# Altium footprint library Connectors.PcbLib: 20 footprints (part 1 of 2)
Each footprint in its own frame and in the unit in brackets; x right, y up, seen from the top. Pads: shape width x height; smd on the part's side, far side on the other; paste and mask are expansions set on the pad; w line width, h text height; cw(c..) or ccw(c..) is an arc to the next point about the centre after c.
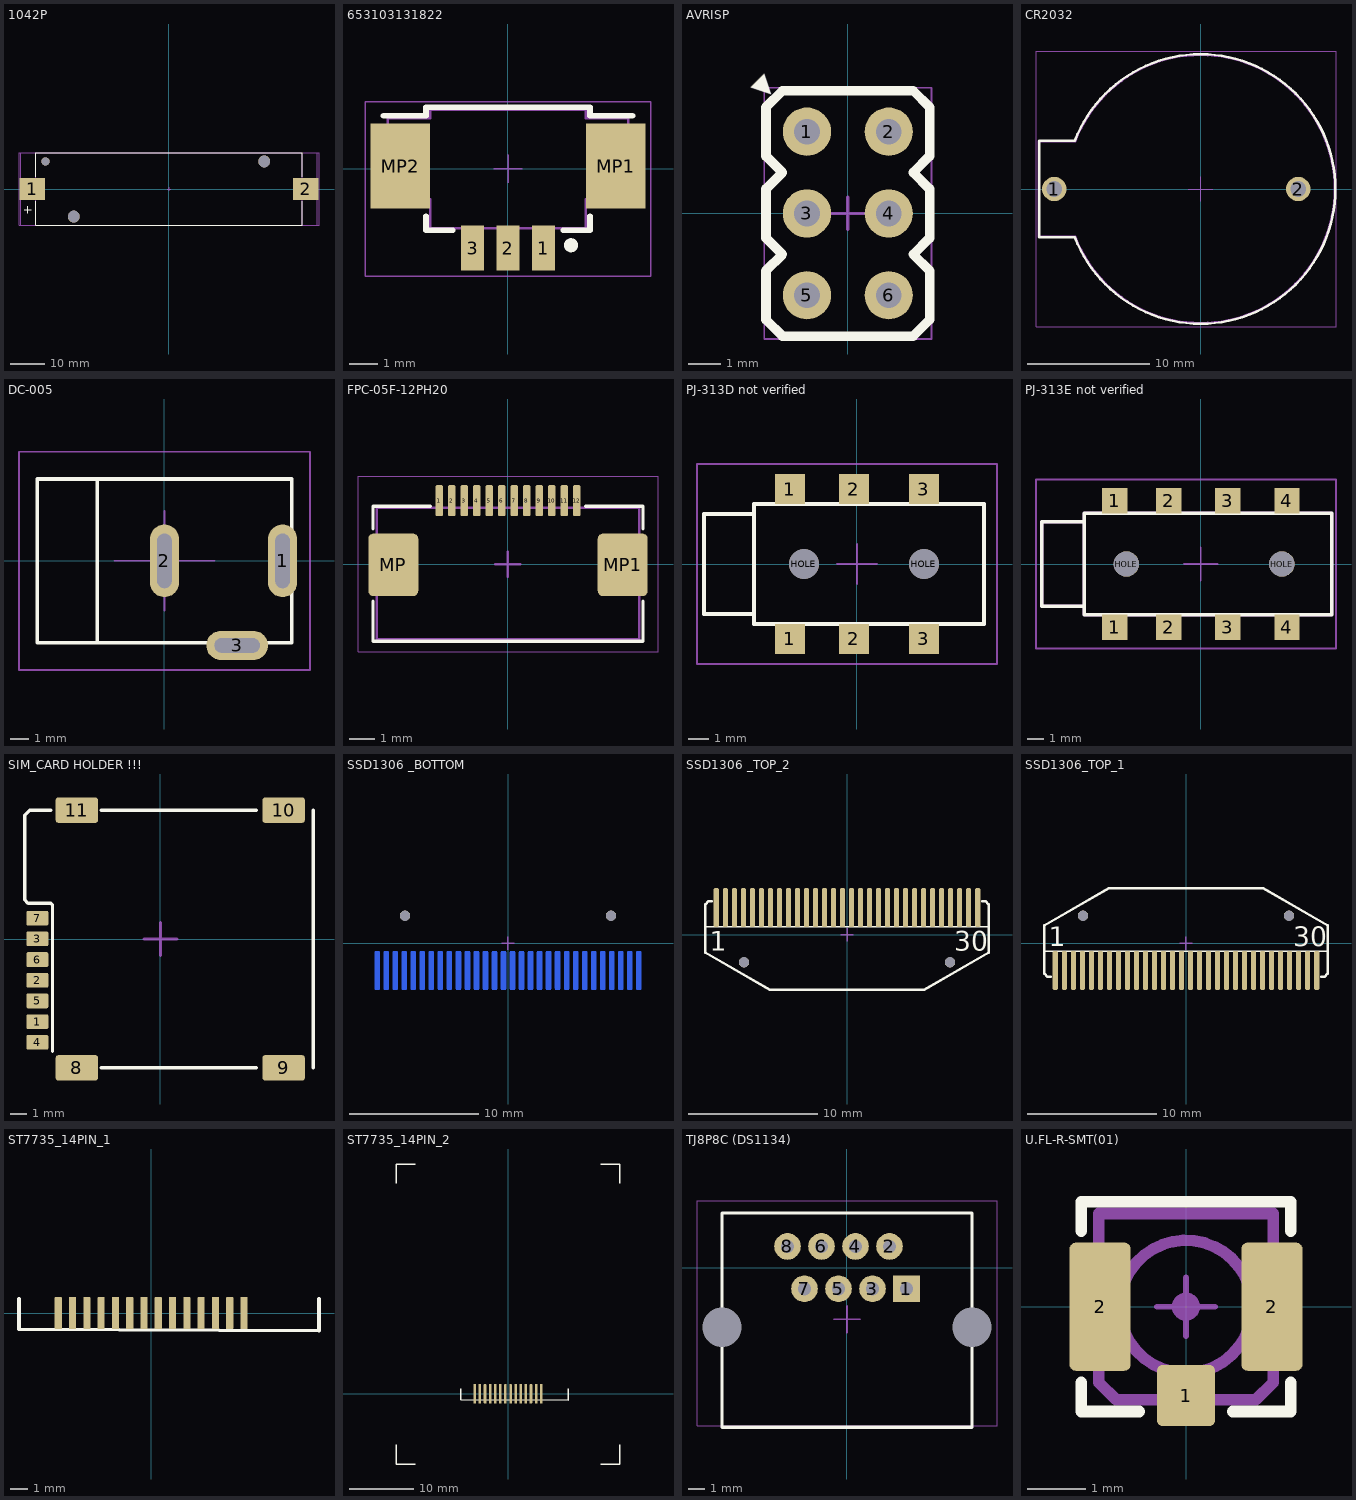
[diagram p0: the footprints below, top view; thin cyan lines are the x and y axes]

## 1042P [mil]
pads (5):
  rect 294x255 smd paste+0 mask+0: 1(-1562.35,0) 2(1562.65,0)
  round 94 hole 94 unplated paste-99999 mask+0: ""(-1411.35,315)
  round 135.83 hole 135.83 unplated paste-99999 mask+0: ""(-1087.35,-315) ""(1087.65,315)
Top Overlay:
  lines w7.87: -1653.54,-236.22 -1574.8,-236.22 ; -1614.17,-275.59 -1614.17,-196.85 ; -1521.85,-142.13 -1521.85,-411.5 1522.15,-411.5 1522.15,-142.13 ; -1521.85,142.13 -1521.85,411.5 1522.15,411.5 1522.15,142.13
Top Assembly:
  lines w7.87: -1692.91,-415.44 -1692.91,415.44 1692.91,415.44 1692.91,-415.44 -1692.91,-415.44
Top 3D Body:
  lines w7.87: -1521.85,-411.5 1522.15,-411.5 1522.15,411.5 -1521.85,411.5 -1521.85,-411.5
Top Courtyard:
  lines w7.87: -1713.29,-415.44 1713.58,-415.44 1713.58,415.44 -1713.29,415.44 -1713.29,-415.44
Top Component Center:
  lines w3.94: -19.54,0 19.83,0 ; 0.15,-19.68 0.15,19.68
3D body "Batt_Keystone_1042P_eec.STEP": height 594.88, standoff -135, extent -1692.86,-406.5 1693.14,406.54

## 653103131822 [mm]
pads (5):
  rect 0.81x1.6 smd: 1(1.25,-2.8) 2(0,-2.8) 3(-1.25,-2.8)
  rect 2.1x3 smd: MP1(3.8,0.1) MP2(-3.8,0.1)
Top Overlay:
  circle w0.25: c2.225,-2.7 r0.125
  lines w0.2: -4.4,1.875 -2.9,1.875 -2.9,2.175 2.9,2.175 2.9,1.875 4.4,1.875 ; -2.9,-1.675 -2.9,-2.175 -1.95,-2.175 ; 1.95,-2.175 2.9,-2.175 2.9,-1.675
Top Assembly:
  lines w0.1: -4.25,1.78 -4.25,-1.08 -2.75,-1.08 -2.75,-2.1 2.75,-2.1 2.75,-1.08 4.25,-1.08 4.25,1.78 ; -4.23,1.8 -2.75,1.8 -2.75,2.1 2.75,2.1 2.75,1.8 4.23,1.8
Top Courtyard:
  lines w0.05: -5.05,-3.8 5.05,-3.8 5.05,2.375 -5.05,2.375 -5.05,-3.8
Top Component Center:
  lines w0.05: -0.5,0 0.5,0 ; 0,-0.5 0,0.5
3D body "653103131822.stp": height 3.4, standoff -0.01, extent -4.25,-3.3 4.25,2.1

## AVRISP [mm]
pads (6):
  round 1.5 hole 0.8 mask+0.05: 1(-1.27,2.54) 2(1.27,2.54) 3(-1.27,0) 4(1.27,0) 5(-1.27,-2.54) 6(1.27,-2.54)
Top Overlay:
  lines w0.3: -2.54,-3.302 -2.032,-3.81 2.032,-3.81 2.54,-3.302 2.54,-1.778 2.032,-1.27 2.54,-0.762 2.54,0.762 2.032,1.27 2.54,1.778 2.54,3.302 2.032,3.81 -2.032,3.81 -2.54,3.302 -2.54,1.778 -2.032,1.27 -2.54,0.762 -2.54,-0.762 -2.032,-1.27 -2.54,-1.778 -2.54,-3.302
  text "▲" at -2.651,4.417 h1
Top Courtyard:
  lines w0.05: -2.6,-3.9 2.6,-3.9 2.6,3.9 -2.6,3.9 -2.6,-3.9
Top Component Center:
  lines w0.1: -0.5,0 0.5,0 ; 0,-0.5 0,0.5

## CR2032 [mm] "KLS5-CR2032-01 (BH-642) (CH224-2032)"
pads (2):
  round 2 hole 1.3 mask+0.05: 1(-12,0) 2(8,0)
Top Overlay:
  lines w0.2: -10.321,-3.95 -13.25,-3.95 -13.25,3.95 -10.321,3.95 ; -10.321,-3.948 ccw(c0,0) -10.321,3.948
Top Assembly:
  lines w0.2: -13.295,-3.93 -13.295,3.93 -10.274,3.93 cw(c0,0) -10.274,-3.93 -13.295,-3.93
Top Courtyard:
  lines w0.05: -13.5,-11.3 -13.5,11.3 11.1,11.3 11.1,-11.3 -13.5,-11.3
Top Component Center:
  lines w0.1: -1,0 1,0 ; 0,-1 0,1
3D body "BH-642.STEP": height 8.5, standoff -4.3, extent -13.3,-11.15 11,11.15

## DC-005 [mm] "DC SOCKET W14.00xD9.00xH11.00"
pads (3):
  oval 1.6x4 hole 0.8 slot 3 at 90 deg mask+0.05: 1(6.5,0) 2(0,0)
  oval 3.4x1.6 hole 0.8 slot 2.5 at 0 deg mask+0.05: 3(4,-4.65)
Top Overlay:
  lines w0.2: -3.7,-4.5 -3.7,4.5 ; -7,-4.5 -7,4.5 7,4.5 7,-4.5 -7,-4.5
Top Assembly:
  lines w0.1: -7,-4.5 7,-4.5 7,4.5 -7,4.5 -7,-4.5
Top Courtyard:
  lines w0.1: -8,-6 -8,6 8,6 8,-6 -8,-6
Top Component Center:
  lines w0.1: -2.75,0 2.75,0 ; 0,-2.75 0,2.75
3D body "DC_Power_Jack_PCB_Mounted_2.1mm.step": height 11, standoff -4.1, extent -7,-4.95 7.2,4.5

## FPC-05F-12PH20 [mm] "XUNPU FPC-05F-12PH20"
pads (14):
  rrect50% 0.3x1.25 smd mask+0.05: 1(-2.75,2.538) 2(-2.25,2.538) 3(-1.75,2.538) 4(-1.25,2.538) 5(-0.75,2.538) 6(-0.25,2.538) 7(0.25,2.538) 8(0.75,2.538) 9(1.25,2.538) 10(1.75,2.538) 11(2.25,2.538) 12(2.75,2.538)
  rrect20% 2x2.5 smd mask+0.05: MP(-4.59,-0.037) MP1(4.59,-0.037)
Top Overlay:
  lines w0.127: -5.4,-1.487 -5.4,-3.087 5.4,-3.087 5.4,-1.487 ; -5.4,1.413 -5.4,2.313 -3.1,2.313 ; 3.1,2.313 5.4,2.313 5.4,1.413
Top Assembly:
  lines w0.1: -5.25,-3 5.25,-3 5.25,2.25 -5.25,2.25 -5.25,-3
Top Courtyard:
  lines w0.05: -6,-3.5 6,-3.5 6,3.5 -6,3.5 -6,-3.5
Top Component Center:
  lines w0.1: -0.5,0 0.5,0 ; 0,-0.5 0,0.5
3D body "FPC-12.stp": height 2.11, standoff 0, extent -5.15,-2.9 5.15,2.95

## PJ-313D not verified [mm] "Audio Jack 3.5mm"
pads (8):
  rect 1.5x1.5 smd mask+0.05: 1(-3.35,-3.75) 1(-3.35,3.75) 2(-0.15,-3.75) 2(-0.15,3.75) 3(3.35,-3.75) 3(3.35,3.75)
  round 1.5 hole 1.5 mask+0.05: HOLE(-2.65,0) HOLE(3.35,0)
Top Overlay:
  lines w0.2: -5.15,-2.5 -7.65,-2.5 -7.65,2.5 -5.15,2.5 ; -5.15,-3 6.35,-3 6.35,3 -5.15,3 -5.15,-3
Top Assembly:
  lines w0.2: -5.15,-2.5 -7.65,-2.5 -7.65,2.5 -5.15,2.5 ; -5.15,-3 -5.15,3 6.35,3 6.35,-3 -5.15,-3
Top Courtyard:
  lines w0.1: -8,-5 7,-5 7,5 -8,5 -8,-5
Top Component Center:
  lines w0.1: -1,0 1,0 ; 0,-1 0,1
3D body "JackPJ313D.SLDPRT": height 5, standoff -1, extent -7.65,-4.5 6.35,4.5

## PJ-313E not verified [mm] "Audio Jack 3.5mm"
pads (10):
  rect 1.5x1.5 smd mask+0.05: 1(-5.1,-3.75) 1(-5.1,3.75) 2(-1.9,-3.75) 2(-1.9,3.75) 3(1.6,-3.75) 3(1.6,3.75) 4(5.1,-3.75) 4(5.1,3.75)
  round 1.5 hole 1.5 mask+0.05: HOLE(-4.4,0) HOLE(4.8,0)
Top Overlay:
  lines w0.2: -6.9,-2.5 -9.4,-2.5 -9.4,2.5 -6.9,2.5 ; -6.9,-3 7.75,-3 7.75,3 -6.9,3 -6.9,-3
Top Assembly:
  lines w0.2: -6.9,-2.5 -9.4,-2.5 -9.4,2.5 -6.9,2.5 ; -6.9,-3 -6.9,3 7.75,3 7.75,-3 -6.9,-3
Top Courtyard:
  lines w0.1: -9.75,-5 8,-5 8,5 -9.75,5 -9.75,-5
Top Component Center:
  lines w0.1: -1,0 1,0 ; 0,-1 0,1
3D body "Jack Pj-315e-sm.SLDPRT": height 5, standoff -0.6, extent -9.4,-4.5 7.8,4.5

## SIM_CARD HOLDER !!! [mm]
pads (11):
  rrect20% 1.35x0.9 smd mask+0.05: 1(-7.552,-5.07) 2(-7.552,-2.53) 3(-7.552,0.01) 4(-7.552,-6.34) 5(-7.552,-3.8) 6(-7.552,-1.26) 7(-7.552,1.28)
  rrect20% 2.6x1.55 smd mask+0.05: 8(-5.128,-7.9) 9(7.552,-7.9) 10(7.552,7.9) 11(-5.128,7.9)
Top Overlay:
  lines w0.2: -6.728,7.9 -8.028,7.9 -8.328,7.6 -8.328,2.4 -8.127,2.2 -6.727,2.2 -6.628,2.1 -6.628,-6.9 ; -3.628,-7.9 5.873,-7.9 ; -3.628,7.9 5.873,7.9 ; 9.372,-7.9 9.372,7.9
Top Component Center:
  lines w0.2: -1,0 1,0 ; 0,-1 0,1

## SSD1306 _BOTTOM [mm] "30-pin 128x64 SSD1306 Display"
pads (32):
  rrect50% 0.4x3 smd far side mask+0.05: 1(10.15,-2.125) 2(9.45,-2.125) 3(8.75,-2.125) 4(8.05,-2.125) 5(7.35,-2.125) 6(6.65,-2.125) 7(5.95,-2.125) 8(5.25,-2.125) 9(4.55,-2.125) 10(3.85,-2.125) 11(3.15,-2.125) 12(2.45,-2.125) 13(1.75,-2.125) 14(1.05,-2.125) 15(0.35,-2.125) 16(-0.35,-2.125) 17(-1.05,-2.125) 18(-1.75,-2.125) 19(-2.45,-2.125) 20(-3.15,-2.125) 21(-3.85,-2.125) 22(-4.55,-2.125) 23(-5.25,-2.125) 24(-5.95,-2.125) 25(-6.65,-2.125) 26(-7.35,-2.125) 27(-8.05,-2.125) 28(-8.75,-2.125) 29(-9.45,-2.125) 30(-10.15,-2.125)
  round 0.8 hole 0.8 mask+0.05: POS_HOLE(-8,2.125) POS_HOLE(8,2.125)
Bottom Overlay:
  lines w0.1: -11,-0.625 11,-0.625
  lines w0.2: -11,1.375 -11,-2.375 -10.75,-2.625 -10.5,-2.625 ; -10.993,1.363 -6,4.262 6,4.262 10.993,1.363 ; 10.5,-2.625 10.75,-2.625 11,-2.375 11,1.375
  text "30" at -8.332,-0.25 h1.5
  text "1" at 10.679,-0.25 h1.5
Bottom Component Center:
  lines w0.1: -0.5,0 0.5,0 ; 0,-0.5 0,0.5
3D body "0.96 OLED - Flat Reverse.stp": height 2.6, standoff -0.56, extent -12.852,-17.179 12.852,5.227

## SSD1306 _TOP_2 [mm] "30-pin 128x64 SSD1306 Display"
pads (32):
  rrect50% 0.4x3 smd mask+0.05: 1(-10.15,2.125) 2(-9.45,2.125) 3(-8.75,2.125) 4(-8.05,2.125) 5(-7.35,2.125) 6(-6.65,2.125) 7(-5.95,2.125) 8(-5.25,2.125) 9(-4.55,2.125) 10(-3.85,2.125) 11(-3.15,2.125) 12(-2.45,2.125) 13(-1.75,2.125) 14(-1.05,2.125) 15(-0.35,2.125) 16(0.35,2.125) 17(1.05,2.125) 18(1.75,2.125) 19(2.45,2.125) 20(3.15,2.125) 21(3.85,2.125) 22(4.55,2.125) 23(5.25,2.125) 24(5.95,2.125) 25(6.65,2.125) 26(7.35,2.125) 27(8.05,2.125) 28(8.75,2.125) 29(9.45,2.125) 30(10.15,2.125)
  round 0.8 hole 0.8 mask+0.05: POS_HOLE(-8,-2.125) POS_HOLE(8,-2.125)
Top Overlay:
  lines w0.1: -11,0.625 11,0.625
  lines w0.2: -11,-1.375 -11,2.375 -10.75,2.625 -10.5,2.625 ; -10.993,-1.363 -6,-4.262 6,-4.262 10.993,-1.363 ; 10.5,2.625 10.75,2.625 11,2.375 11,-1.375
  text "1" at -10.679,-1.25 h1.5
  text "30" at 8.332,-1.25 h1.5
Top Component Center:
  lines w0.1: -0.5,0 0.5,0 ; 0,-0.5 0,0.5
3D body "0.96 OLED - Flush.stp": height 1.65, standoff -0.02, extent -12.852,-4.514 12.852,17.279

## SSD1306_TOP_1 [mm] "30-pin 128x64 SSD1306 Display"
pads (32):
  rrect50% 0.4x3 smd mask+0.05: 1(-10.15,-2.125) 2(-9.45,-2.125) 3(-8.75,-2.125) 4(-8.05,-2.125) 5(-7.35,-2.125) 6(-6.65,-2.125) 7(-5.95,-2.125) 8(-5.25,-2.125) 9(-4.55,-2.125) 10(-3.85,-2.125) 11(-3.15,-2.125) 12(-2.45,-2.125) 13(-1.75,-2.125) 14(-1.05,-2.125) 15(-0.35,-2.125) 16(0.35,-2.125) 17(1.05,-2.125) 18(1.75,-2.125) 19(2.45,-2.125) 20(3.15,-2.125) 21(3.85,-2.125) 22(4.55,-2.125) 23(5.25,-2.125) 24(5.95,-2.125) 25(6.65,-2.125) 26(7.35,-2.125) 27(8.05,-2.125) 28(8.75,-2.125) 29(9.45,-2.125) 30(10.15,-2.125)
  round 0.8 hole 0.8 mask+0.05: POS_HOLE(-8,2.125) POS_HOLE(8,2.125)
Top Overlay:
  lines w0.1: -11,-0.625 11,-0.625
  lines w0.2: -11,1.375 -11,-2.375 -10.75,-2.625 -10.5,-2.625 ; -10.993,1.363 -6,4.262 6,4.262 10.993,1.363 ; 10.5,-2.625 10.75,-2.625 11,-2.375 11,1.375
  text "1" at -10.679,-0.25 h1.5
  text "30" at 8.332,-0.25 h1.5
Top Component Center:
  lines w0.1: -0.5,0 0.5,0 ; 0,-0.5 0,0.5
3D body "0.96 OLED - Flat.stp": height 1.4, standoff -0.01, extent -12.852,-2.6 12.852,27.245

## ST7735_14PIN_1 [mm]
pads (14):
  rrect20% 0.4x1.8 smd mask+0.05: 1(5.2,0) 2(4.4,0) 3(3.6,0) 4(2.8,0) 5(2,0) 6(1.2,0) 7(0.4,0) 8(-0.4,0) 9(-1.2,0) 10(-2,0) 11(-2.8,0) 12(-3.6,0) 13(-4.4,0) 14(-5.2,0)
Top Overlay:
  lines w0.2: -7.4,0.8 -7.4,-0.9 9.4,-1 9.4,0.8
3D body "1.8in TFT (Without Glass)- Flat Mount 1.stp": height 3.54, standoff 0.44, extent -17.335,-0.9 17.336,59.019

## ST7735_14PIN_2 [mm]
pads (14):
  rrect20% 0.4x3 smd mask+0.05: 1(5.2,0) 2(4.4,0) 3(3.6,0) 4(2.8,0) 5(2,0) 6(1.2,0) 7(0.4,0) 8(-0.4,0) 9(-1.2,0) 10(-2,0) 11(-2.8,0) 12(-3.6,0) 13(-4.4,0) 14(-5.2,0)
Top Overlay:
  lines w0.2: -17.5,-8 -17.5,-11 -14.5,-11 ; -17.5,33 -17.5,36 -14.5,36 ; -7.4,0.8 -7.4,-0.9 9.4,-1 9.4,0.8 ; 14.5,-11 17.5,-11 17.5,-8 ; 14.5,36 17.5,36 17.5,33
3D body "1.8in TFT (Without Glass)- Tucked Cable.stp": height 5.54, standoff 2.47, extent -17.335,-11.053 17.336,35.817

## TJ8P8C (DS1134) [mm] "RJ45"
pads (10):
  rect 1.6x1.6 hole 0.8 mask+0.05: 1(3.57,-1.27)
  round 1.6 hole 0.8 mask+0.05: 2(2.55,1.27) 3(1.53,-1.27) 4(0.51,1.27) 5(-0.51,-1.27) 6(-1.53,1.27) 7(-2.55,-1.27) 8(-3.57,1.27)
  round 0 hole 2.36 unplated mask+0.05: HOLE(-7.5,-3.57) HOLE(7.5,-3.57)
Top Overlay:
  lines w0.2: -7.5,-9.57 7.5,-9.57 7.5,3.28 -7.5,3.28 -7.5,-9.57
Top Assembly:
  lines w0.1: -7.5,-9.57 7.5,-9.57 7.5,3.28 -7.5,3.28 -7.5,-9.57
Top Courtyard:
  lines w0.05: -9,-9.5 9,-9.5 9,4 -9,4 -9,-9.5
Top Component Center:
  lines w0.1: -0.8,-3.1 0.8,-3.1 ; 0,-3.9 0,-2.3
3D body "TJ8P8C 8p 8c compact.stp": height 14.4, standoff -3.2, extent -8.7,-9.6 8.7,3.4

## U.FL-R-SMT(01) [mm]
pads (3):
  rrect20% 1x1.05 smd mask+0.05: 1(0,-1.525)
  rrect20% 1.05x2.2 smd mask+0.05: 2(-1.475,0) 2(1.475,0)
Top Overlay:
  lines w0.2: -1.8,-1.3 -1.8,-1.8 -0.8,-1.8 ; -1.8,1.3 -1.8,1.8 1.8,1.8 1.8,1.3 ; 0.8,-1.8 1.8,-1.8 1.8,-1.3
Top Assembly:
  circle w0.2: c0,0 r1.14
  circle w0.2: c0,0 r0.141
  lines w0.2: -1.5,-1.3 -1.5,1.6 1.5,1.6 1.5,-1.3 1.2,-1.6 -1.2,-1.6 -1.5,-1.3
Top Component Center:
  lines w0.1: -0.5,0 0.5,0 ; 0,-0.5 0,0.5
3D body "u.Fl Antenna Connector - 523-A-1JB.SLDPRT": height 1.25, standoff 0, extent -1.5,-1.55 1.5,1.55